# Altium schematic symbol library MCU_ST_STM32F4.SchLib: 211 symbols (part 7 of 10)
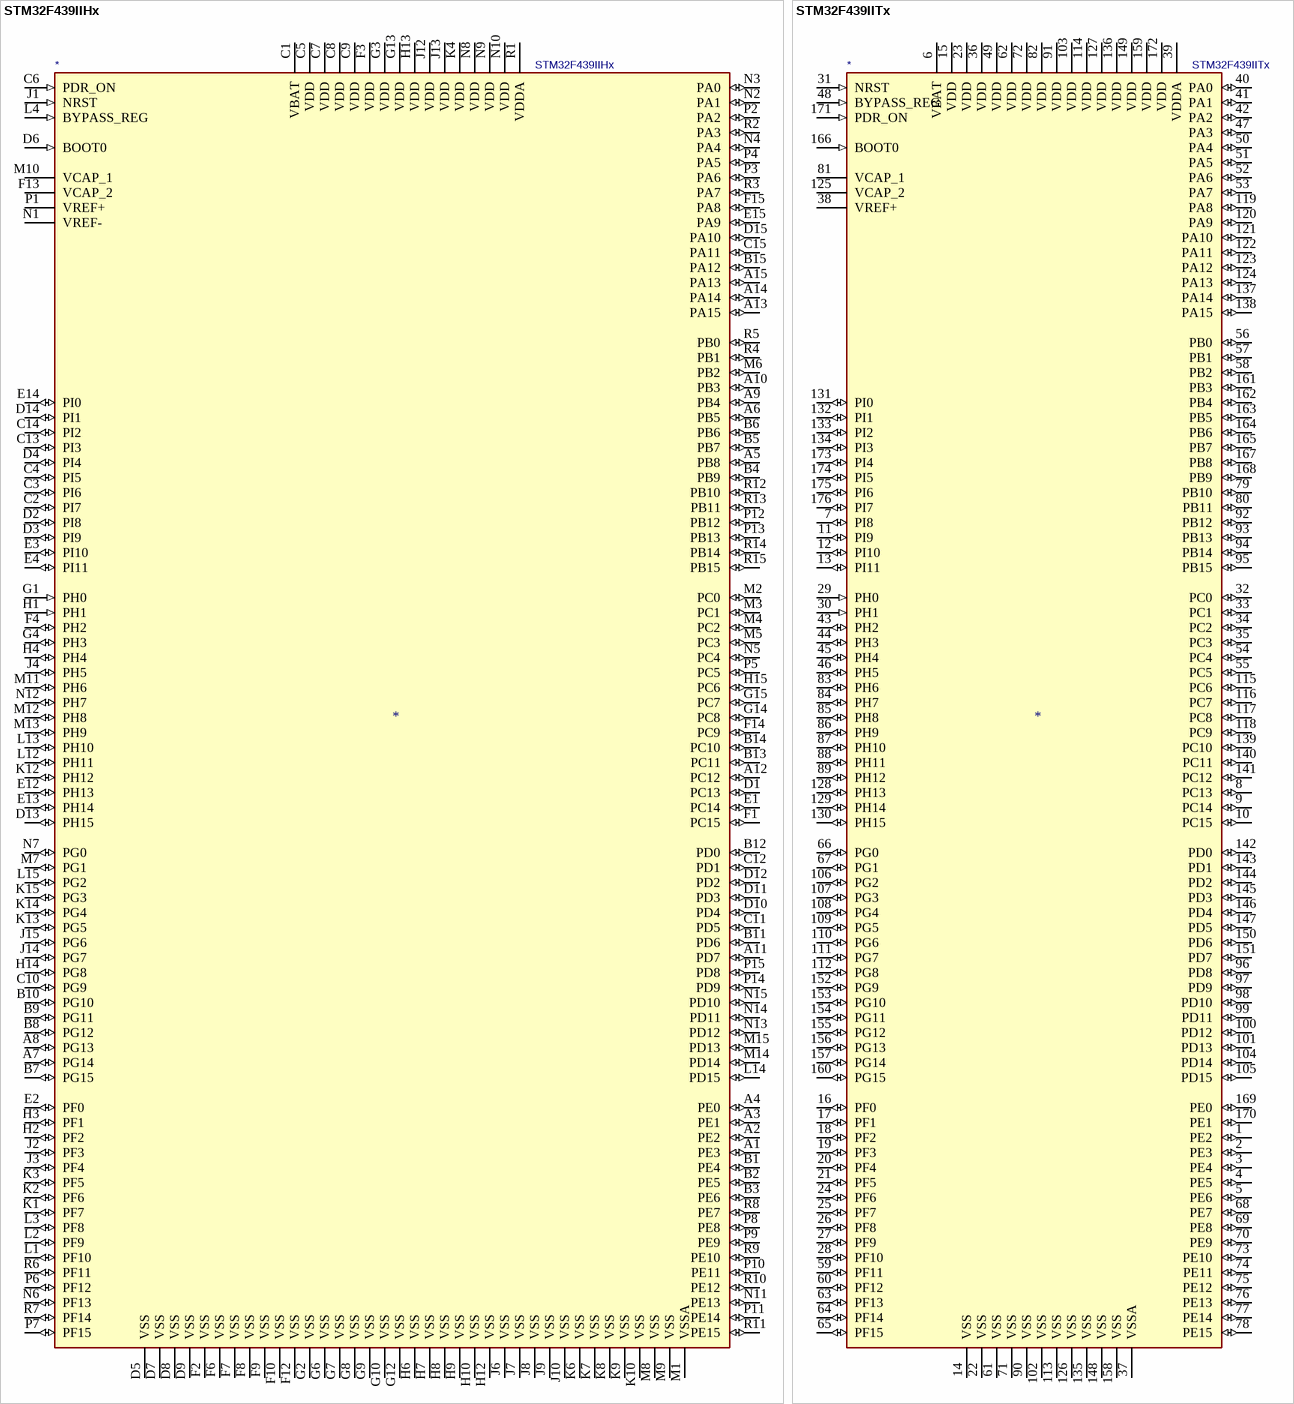
[diagram p68: symbols STM32F439IIHx to STM32F439IITx]

## STM32F439IITx
designator *  value STM32F439IITx
ki_keywords: ARM Cortex-M4 STM32F4 STM32F429/439; ki_description: ARM Cortex-M4 MCU, 2048KB flash, 192KB RAM, 180MHz, 1.7-3.6V, 140 GPIO, LQFP-176; ki_fp_filters: LQFP*24x24mm*P0.5mm*; Footprint: Package_QFP:LQFP-176_24x24mm_P0.5mm; Supplier: http://www.st.com/st-web-ui/static/active/en/resource/technical/document/datasheet/DM00077036.pdf
footprint LQFP-176_24x24mm_P0.5mm
pins: 1 PE2 (io), 2 PE3 (io), 3 PE4 (io), 4 PE5 (io), 5 PE6 (io), 6 VBAT (power), 7 PI8 (io), 8 PC13 (io), 9 PC14 (io), 10 PC15 (io), 11 PI9 (io), 12 PI10 (io), 13 PI11 (io), 14 VSS (power), 15 VDD (power), 16 PF0 (io), 17 PF1 (io), 18 PF2 (io), 19 PF3 (io), 20 PF4 (io), 21 PF5 (io), 22 VSS (power), 23 VDD (power), 24 PF6 (io), 25 PF7 (io), 26 PF8 (io), 27 PF9 (io), 28 PF10 (io), 29 PH0 (in), 30 PH1 (in), 31 NRST (in), 32 PC0 (io), 33 PC1 (io), 34 PC2 (io), 35 PC3 (io), 36 VDD (power), 37 VSSA (power), 38 VREF+ (power), 39 VDDA (power), 40 PA0 (io), 41 PA1 (io), 42 PA2 (io), 43 PH2 (io), 44 PH3 (io), 45 PH4 (io), 46 PH5 (io), 47 PA3 (io), 48 BYPASS_REG (in), 49 VDD (power), 50 PA4 (io), 51 PA5 (io), 52 PA6 (io), 53 PA7 (io), 54 PC4 (io), 55 PC5 (io), 56 PB0 (io), 57 PB1 (io), 58 PB2 (io), 59 PF11 (io), 60 PF12 (io), 61 VSS (power), 62 VDD (power), 63 PF13 (io), 64 PF14 (io), 65 PF15 (io), 66 PG0 (io), 67 PG1 (io), 68 PE7 (io), 69 PE8 (io), 70 PE9 (io), 71 VSS (power), 72 VDD (power), 73 PE10 (io), 74 PE11 (io), 75 PE12 (io), 76 PE13 (io), 77 PE14 (io), 78 PE15 (io), 79 PB10 (io), 80 PB11 (io), 81 VCAP_1 (power), 82 VDD (power), 83 PH6 (io), 84 PH7 (io), 85 PH8 (io), 86 PH9 (io), 87 PH10 (io), 88 PH11 (io), 89 PH12 (io), 90 VSS (power), 91 VDD (power), 92 PB12 (io), 93 PB13 (io), 94 PB14 (io), 95 PB15 (io), 96 PD8 (io), 97 PD9 (io), 98 PD10 (io), 99 PD11 (io), 100 PD12 (io), 101 PD13 (io), 102 VSS (power), 103 VDD (power), 104 PD14 (io), 105 PD15 (io), 106 PG2 (io), 107 PG3 (io), 108 PG4 (io), 109 PG5 (io), 110 PG6 (io), 111 PG7 (io), 112 PG8 (io), 113 VSS (power), 114 VDD (power), 115 PC6 (io), 116 PC7 (io), 117 PC8 (io), 118 PC9 (io), 119 PA8 (io), 120 PA9 (io), 121 PA10 (io), 122 PA11 (io), 123 PA12 (io), 124 PA13 (io), 125 VCAP_2 (power), 126 VSS (power), 127 VDD (power), 128 PH13 (io), 129 PH14 (io), 130 PH15 (io), 131 PI0 (io), 132 PI1 (io), 133 PI2 (io), 134 PI3 (io), 135 VSS (power), 136 VDD (power), 137 PA14 (io), 138 PA15 (io), 139 PC10 (io), 140 PC11 (io), 141 PC12 (io), 142 PD0 (io), 143 PD1 (io), 144 PD2 (io), 145 PD3 (io), 146 PD4 (io), 147 PD5 (io), 148 VSS (power), 149 VDD (power), 150 PD6 (io), 151 PD7 (io), 152 PG9 (io), 153 PG10 (io), 154 PG11 (io), 155 PG12 (io), 156 PG13 (io), 157 PG14 (io), 158 VSS (power), 159 VDD (power), 160 PG15 (io), 161 PB3 (io), 162 PB4 (io), 163 PB5 (io), 164 PB6 (io), 165 PB7 (io), 166 BOOT0 (in), 167 PB8 (io), 168 PB9 (io), 169 PE0 (io), 170 PE1 (io), 171 PDR_ON (in), 172 VDD (power), 173 PI4 (io), 174 PI5 (io), 175 PI6 (io), 176 PI7 (io)

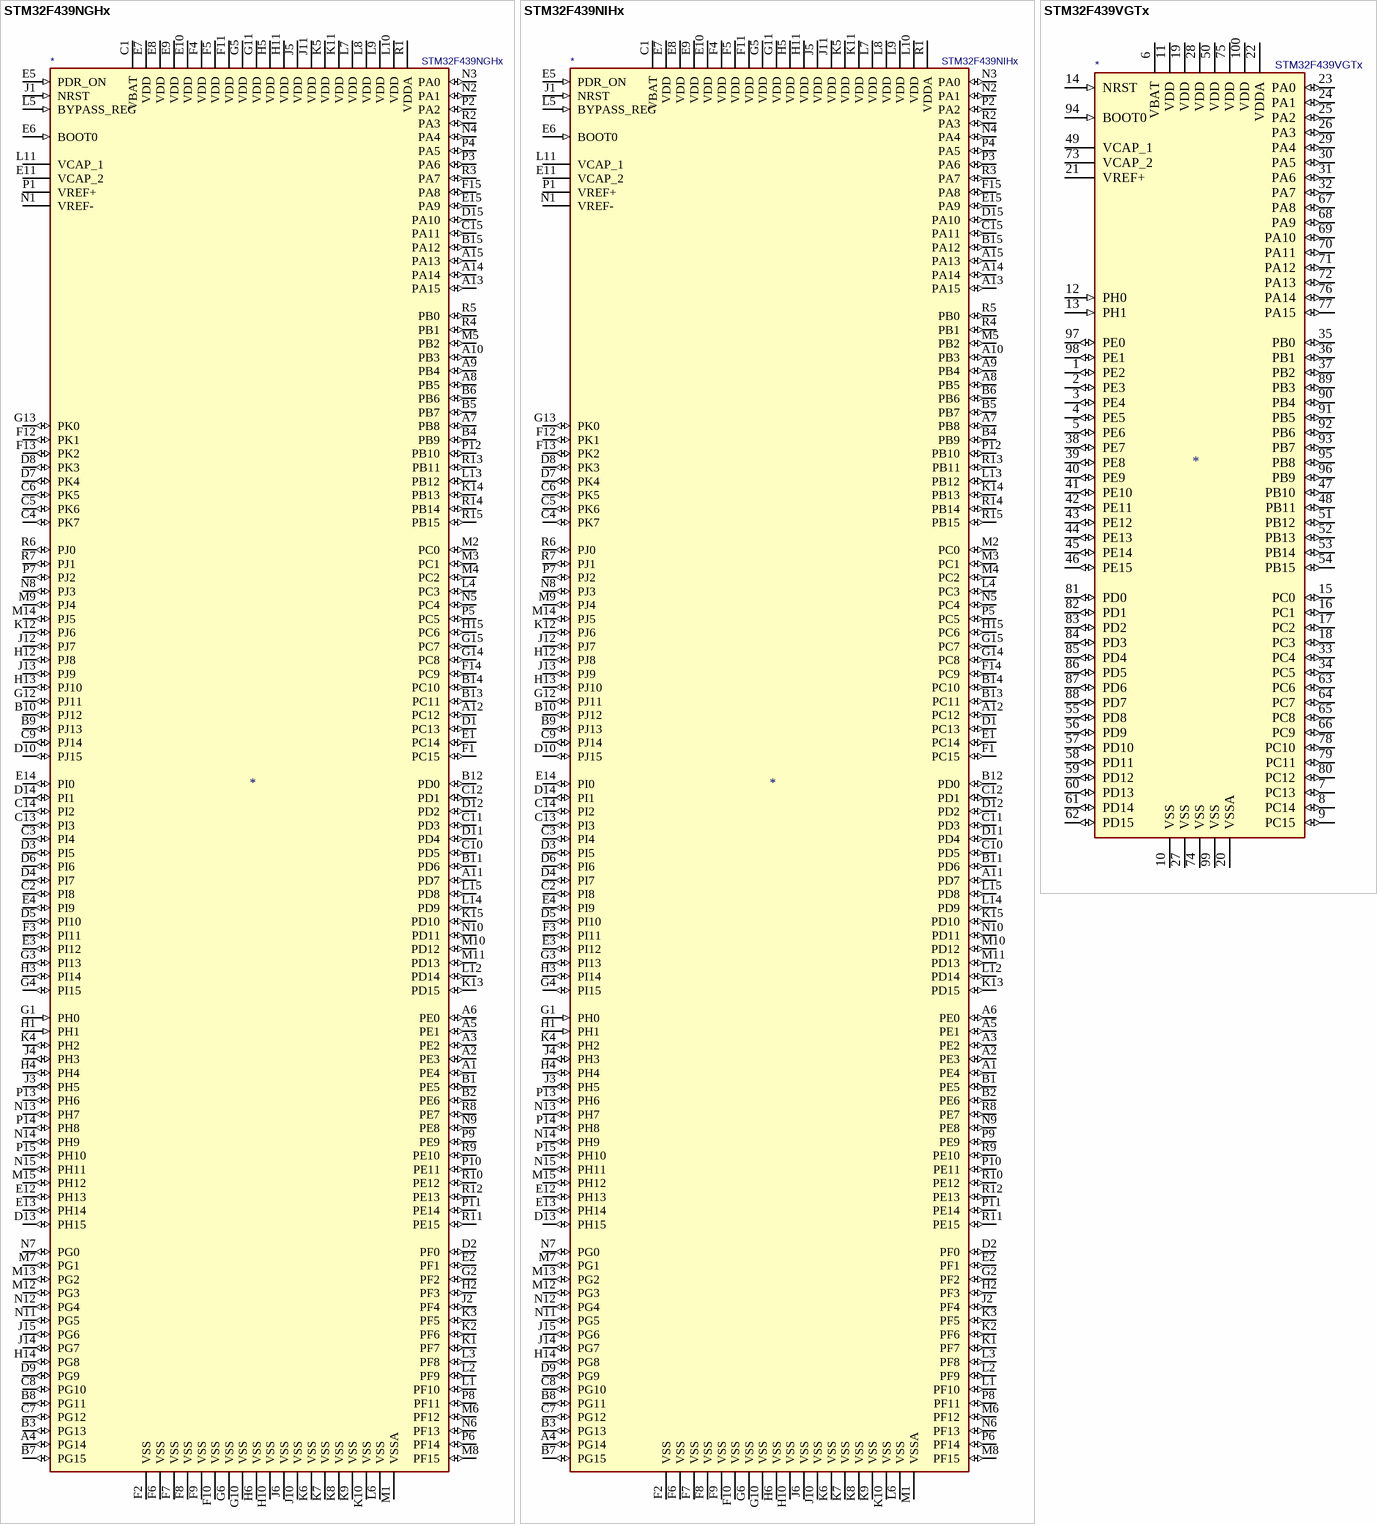
[diagram p41: symbols STM32F439NGHx to STM32F439VGTx]

## STM32F439NGHx
designator *  value STM32F439NGHx
ki_keywords: ARM Cortex-M4 STM32F4 STM32F429/439; ki_description: ARM Cortex-M4 MCU, 1024KB flash, 192KB RAM, 180MHz, 1.7-3.6V, 168 GPIO, TFBGA-216; ki_fp_filters: TFBGA*13x13mm*Layout15x15*P0.8mm*; Footprint: Package_BGA:TFBGA-216_13x13mm_Layout15x15_P0.8mm; Supplier: http://www.st.com/st-web-ui/static/active/en/resource/technical/document/datasheet/DM00077036.pdf
footprint TFBGA-216_13x13mm_Layout15x15_P0.8mm
pins: A1 PE4 (io), A2 PE3 (io), A3 PE2 (io), A4 PG14 (io), A5 PE1 (io), A6 PE0 (io), A7 PB8 (io), A8 PB5 (io), A9 PB4 (io), A10 PB3 (io), A11 PD7 (io), A12 PC12 (io), A13 PA15 (io), A14 PA14 (io), A15 PA13 (io), B1 PE5 (io), B2 PE6 (io), B3 PG13 (io), B4 PB9 (io), B5 PB7 (io), B6 PB6 (io), B7 PG15 (io), B8 PG11 (io), B9 PJ13 (io), B10 PJ12 (io), B11 PD6 (io), B12 PD0 (io), B13 PC11 (io), B14 PC10 (io), B15 PA12 (io), C1 VBAT (power), C2 PI8 (io), C3 PI4 (io), C4 PK7 (io), C5 PK6 (io), C6 PK5 (io), C7 PG12 (io), C8 PG10 (io), C9 PJ14 (io), C10 PD5 (io), C11 PD3 (io), C12 PD1 (io), C13 PI3 (io), C14 PI2 (io), C15 PA11 (io), D1 PC13 (io), D2 PF0 (io), D3 PI5 (io), D4 PI7 (io), D5 PI10 (io), D6 PI6 (io), D7 PK4 (io), D8 PK3 (io), D9 PG9 (io), D10 PJ15 (io), D11 PD4 (io), D12 PD2 (io), D13 PH15 (io), D14 PI1 (io), D15 PA10 (io), E1 PC14 (io), E2 PF1 (io), E3 PI12 (io), E4 PI9 (io), E5 PDR_ON (in), E6 BOOT0 (in), E7 VDD (power), E8 VDD (power), E9 VDD (power), E10 VDD (power), E11 VCAP_2 (power), E12 PH13 (io), E13 PH14 (io), E14 PI0 (io), E15 PA9 (io), F1 PC15 (io), F2 VSS (power), F3 PI11 (io), F4 VDD (power), F5 VDD (power), F6 VSS (power), F7 VSS (power), F8 VSS (power), F9 VSS (power), F10 VSS (power), F11 VDD (power), F12 PK1 (io), F13 PK2 (io), F14 PC9 (io), F15 PA8 (io), G1 PH0 (in), G2 PF2 (io), G3 PI13 (io), G4 PI15 (io), G5 VDD (power), G6 VSS (power), G10 VSS (power), G11 VDD (power), G12 PJ11 (io), G13 PK0 (io), G14 PC8 (io), G15 PC7 (io), H1 PH1 (in), H2 PF3 (io), H3 PI14 (io), H4 PH4 (io), H5 VDD (power), H6 VSS (power), H10 VSS (power), H11 VDD (power), H12 PJ8 (io), H13 PJ10 (io), H14 PG8 (io), H15 PC6 (io), J1 NRST (in), J2 PF4 (io), J3 PH5 (io), J4 PH3 (io), J5 VDD (power), J6 VSS (power), J10 VSS (power), J11 VDD (power), J12 PJ7 (io), J13 PJ9 (io), J14 PG7 (io), J15 PG6 (io), K1 PF7 (io), K2 PF6 (io), K3 PF5 (io), K4 PH2 (io), K5 VDD (power), K6 VSS (power), K7 VSS (power), K8 VSS (power), K9 VSS (power), K10 VSS (power), K11 VDD (power), K12 PJ6 (io), K13 PD15 (io), K14 PB13 (io), K15 PD10 (io), L1 PF10 (io), L2 PF9 (io), L3 PF8 (io), L4 PC3 (io), L5 BYPASS_REG (in), L6 VSS (power), L7 VDD (power), L8 VDD (power), L9 VDD (power), L10 VDD (power), L11 VCAP_1 (power), L12 PD14 (io), L13 PB12 (io), L14 PD9 (io), L15 PD8 (io), M1 VSSA (power), M2 PC0 (io), M3 PC1 (io), M4 PC2 (io), M5 PB2 (io), M6 PF12 (io), M7 PG1 (io), M8 PF15 (io), M9 PJ4 (io), M10 PD12 (io), M11 PD13 (io), M12 PG3 (io), M13 PG2 (io), M14 PJ5 (io), M15 PH12 (io), N1 VREF- (power), N2 PA1 (io), N3 PA0 (io), N4 PA4 (io), N5 PC4 (io), N6 PF13 (io), N7 PG0 (io), N8 PJ3 (io), N9 PE8 (io), N10 PD11 (io), N11 PG5 (io), N12 PG4 (io), N13 PH7 (io), N14 PH9 (io), N15 PH11 (io), P1 VREF+ (power), P2 PA2 (io), P3 PA6 (io), P4 PA5 (io), P5 PC5 (io), P6 PF14 (io), P7 PJ2 (io), P8 PF11 (io), P9 PE9 (io), P10 PE11 (io), P11 PE14 (io), P12 PB10 (io), P13 PH6 (io), P14 PH8 (io), P15 PH10 (io), R1 VDDA (power), R2 PA3 (io), R3 PA7 (io), R4 PB1 (io), R5 PB0 (io), R6 PJ0 (io), R7 PJ1 (io), R8 PE7 (io), R9 PE10 (io), R10 PE12 (io), R11 PE15 (io), R12 PE13 (io), R13 PB11 (io), R14 PB14 (io), R15 PB15 (io)

## STM32F439NIHx
designator *  value STM32F439NIHx
ki_keywords: ARM Cortex-M4 STM32F4 STM32F429/439; ki_description: ARM Cortex-M4 MCU, 2048KB flash, 192KB RAM, 180MHz, 1.7-3.6V, 168 GPIO, TFBGA-216; ki_fp_filters: TFBGA*13x13mm*Layout15x15*P0.8mm*; Footprint: Package_BGA:TFBGA-216_13x13mm_Layout15x15_P0.8mm; Supplier: http://www.st.com/st-web-ui/static/active/en/resource/technical/document/datasheet/DM00077036.pdf
footprint TFBGA-216_13x13mm_Layout15x15_P0.8mm
pins: A1 PE4 (io), A2 PE3 (io), A3 PE2 (io), A4 PG14 (io), A5 PE1 (io), A6 PE0 (io), A7 PB8 (io), A8 PB5 (io), A9 PB4 (io), A10 PB3 (io), A11 PD7 (io), A12 PC12 (io), A13 PA15 (io), A14 PA14 (io), A15 PA13 (io), B1 PE5 (io), B2 PE6 (io), B3 PG13 (io), B4 PB9 (io), B5 PB7 (io), B6 PB6 (io), B7 PG15 (io), B8 PG11 (io), B9 PJ13 (io), B10 PJ12 (io), B11 PD6 (io), B12 PD0 (io), B13 PC11 (io), B14 PC10 (io), B15 PA12 (io), C1 VBAT (power), C2 PI8 (io), C3 PI4 (io), C4 PK7 (io), C5 PK6 (io), C6 PK5 (io), C7 PG12 (io), C8 PG10 (io), C9 PJ14 (io), C10 PD5 (io), C11 PD3 (io), C12 PD1 (io), C13 PI3 (io), C14 PI2 (io), C15 PA11 (io), D1 PC13 (io), D2 PF0 (io), D3 PI5 (io), D4 PI7 (io), D5 PI10 (io), D6 PI6 (io), D7 PK4 (io), D8 PK3 (io), D9 PG9 (io), D10 PJ15 (io), D11 PD4 (io), D12 PD2 (io), D13 PH15 (io), D14 PI1 (io), D15 PA10 (io), E1 PC14 (io), E2 PF1 (io), E3 PI12 (io), E4 PI9 (io), E5 PDR_ON (in), E6 BOOT0 (in), E7 VDD (power), E8 VDD (power), E9 VDD (power), E10 VDD (power), E11 VCAP_2 (power), E12 PH13 (io), E13 PH14 (io), E14 PI0 (io), E15 PA9 (io), F1 PC15 (io), F2 VSS (power), F3 PI11 (io), F4 VDD (power), F5 VDD (power), F6 VSS (power), F7 VSS (power), F8 VSS (power), F9 VSS (power), F10 VSS (power), F11 VDD (power), F12 PK1 (io), F13 PK2 (io), F14 PC9 (io), F15 PA8 (io), G1 PH0 (in), G2 PF2 (io), G3 PI13 (io), G4 PI15 (io), G5 VDD (power), G6 VSS (power), G10 VSS (power), G11 VDD (power), G12 PJ11 (io), G13 PK0 (io), G14 PC8 (io), G15 PC7 (io), H1 PH1 (in), H2 PF3 (io), H3 PI14 (io), H4 PH4 (io), H5 VDD (power), H6 VSS (power), H10 VSS (power), H11 VDD (power), H12 PJ8 (io), H13 PJ10 (io), H14 PG8 (io), H15 PC6 (io), J1 NRST (in), J2 PF4 (io), J3 PH5 (io), J4 PH3 (io), J5 VDD (power), J6 VSS (power), J10 VSS (power), J11 VDD (power), J12 PJ7 (io), J13 PJ9 (io), J14 PG7 (io), J15 PG6 (io), K1 PF7 (io), K2 PF6 (io), K3 PF5 (io), K4 PH2 (io), K5 VDD (power), K6 VSS (power), K7 VSS (power), K8 VSS (power), K9 VSS (power), K10 VSS (power), K11 VDD (power), K12 PJ6 (io), K13 PD15 (io), K14 PB13 (io), K15 PD10 (io), L1 PF10 (io), L2 PF9 (io), L3 PF8 (io), L4 PC3 (io), L5 BYPASS_REG (in), L6 VSS (power), L7 VDD (power), L8 VDD (power), L9 VDD (power), L10 VDD (power), L11 VCAP_1 (power), L12 PD14 (io), L13 PB12 (io), L14 PD9 (io), L15 PD8 (io), M1 VSSA (power), M2 PC0 (io), M3 PC1 (io), M4 PC2 (io), M5 PB2 (io), M6 PF12 (io), M7 PG1 (io), M8 PF15 (io), M9 PJ4 (io), M10 PD12 (io), M11 PD13 (io), M12 PG3 (io), M13 PG2 (io), M14 PJ5 (io), M15 PH12 (io), N1 VREF- (power), N2 PA1 (io), N3 PA0 (io), N4 PA4 (io), N5 PC4 (io), N6 PF13 (io), N7 PG0 (io), N8 PJ3 (io), N9 PE8 (io), N10 PD11 (io), N11 PG5 (io), N12 PG4 (io), N13 PH7 (io), N14 PH9 (io), N15 PH11 (io), P1 VREF+ (power), P2 PA2 (io), P3 PA6 (io), P4 PA5 (io), P5 PC5 (io), P6 PF14 (io), P7 PJ2 (io), P8 PF11 (io), P9 PE9 (io), P10 PE11 (io), P11 PE14 (io), P12 PB10 (io), P13 PH6 (io), P14 PH8 (io), P15 PH10 (io), R1 VDDA (power), R2 PA3 (io), R3 PA7 (io), R4 PB1 (io), R5 PB0 (io), R6 PJ0 (io), R7 PJ1 (io), R8 PE7 (io), R9 PE10 (io), R10 PE12 (io), R11 PE15 (io), R12 PE13 (io), R13 PB11 (io), R14 PB14 (io), R15 PB15 (io)

## STM32F439VGTx
designator *  value STM32F439VGTx
ki_keywords: ARM Cortex-M4 STM32F4 STM32F429/439; ki_description: ARM Cortex-M4 MCU, 1024KB flash, 192KB RAM, 180MHz, 1.7-3.6V, 82 GPIO, LQFP-100; ki_fp_filters: LQFP*14x14mm*P0.5mm*; Footprint: Package_QFP:LQFP-100_14x14mm_P0.5mm; Supplier: http://www.st.com/st-web-ui/static/active/en/resource/technical/document/datasheet/DM00077036.pdf
footprint LQFP-100_14x14mm_P0.5mm
pins: 1 PE2 (io), 2 PE3 (io), 3 PE4 (io), 4 PE5 (io), 5 PE6 (io), 6 VBAT (power), 7 PC13 (io), 8 PC14 (io), 9 PC15 (io), 10 VSS (power), 11 VDD (power), 12 PH0 (in), 13 PH1 (in), 14 NRST (in), 15 PC0 (io), 16 PC1 (io), 17 PC2 (io), 18 PC3 (io), 19 VDD (power), 20 VSSA (power), 21 VREF+ (power), 22 VDDA (power), 23 PA0 (io), 24 PA1 (io), 25 PA2 (io), 26 PA3 (io), 27 VSS (power), 28 VDD (power), 29 PA4 (io), 30 PA5 (io), 31 PA6 (io), 32 PA7 (io), 33 PC4 (io), 34 PC5 (io), 35 PB0 (io), 36 PB1 (io), 37 PB2 (io), 38 PE7 (io), 39 PE8 (io), 40 PE9 (io), 41 PE10 (io), 42 PE11 (io), 43 PE12 (io), 44 PE13 (io), 45 PE14 (io), 46 PE15 (io), 47 PB10 (io), 48 PB11 (io), 49 VCAP_1 (power), 50 VDD (power), 51 PB12 (io), 52 PB13 (io), 53 PB14 (io), 54 PB15 (io), 55 PD8 (io), 56 PD9 (io), 57 PD10 (io), 58 PD11 (io), 59 PD12 (io), 60 PD13 (io), 61 PD14 (io), 62 PD15 (io), 63 PC6 (io), 64 PC7 (io), 65 PC8 (io), 66 PC9 (io), 67 PA8 (io), 68 PA9 (io), 69 PA10 (io), 70 PA11 (io), 71 PA12 (io), 72 PA13 (io), 73 VCAP_2 (power), 74 VSS (power), 75 VDD (power), 76 PA14 (io), 77 PA15 (io), 78 PC10 (io), 79 PC11 (io), 80 PC12 (io), 81 PD0 (io), 82 PD1 (io), 83 PD2 (io), 84 PD3 (io), 85 PD4 (io), 86 PD5 (io), 87 PD6 (io), 88 PD7 (io), 89 PB3 (io), 90 PB4 (io), 91 PB5 (io), 92 PB6 (io), 93 PB7 (io), 94 BOOT0 (in), 95 PB8 (io), 96 PB9 (io), 97 PE0 (io), 98 PE1 (io), 99 VSS (power), 100 VDD (power)

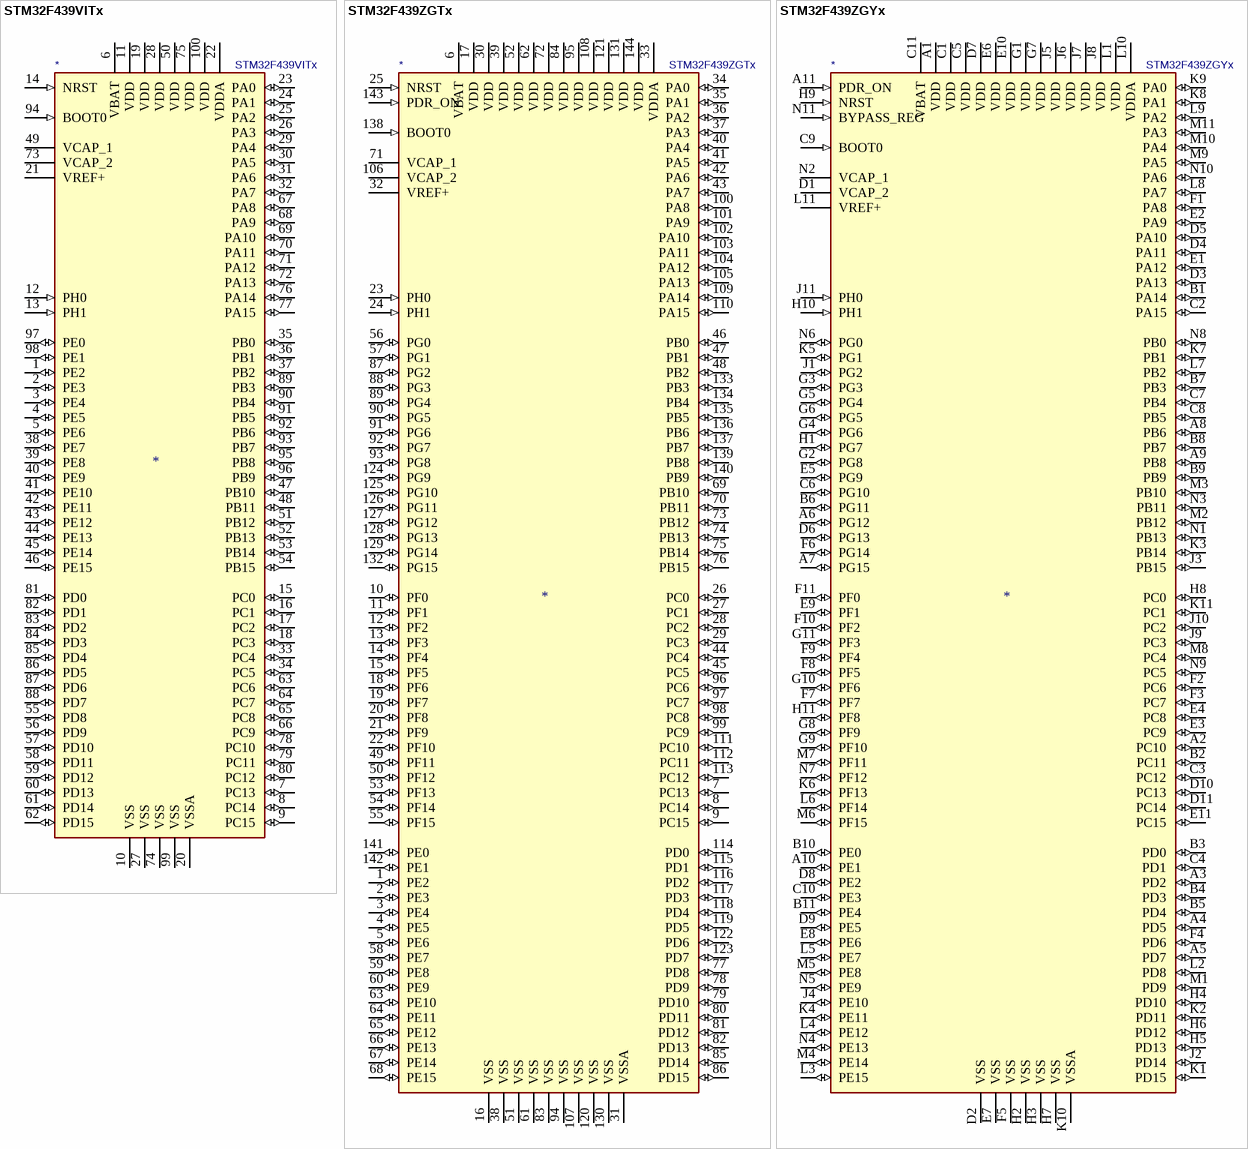
[diagram p42: symbols STM32F439VITx to STM32F439ZGYx]

## STM32F439VITx
designator *  value STM32F439VITx
ki_keywords: ARM Cortex-M4 STM32F4 STM32F429/439; ki_description: ARM Cortex-M4 MCU, 2048KB flash, 192KB RAM, 180MHz, 1.7-3.6V, 82 GPIO, LQFP-100; ki_fp_filters: LQFP*14x14mm*P0.5mm*; Footprint: Package_QFP:LQFP-100_14x14mm_P0.5mm; Supplier: http://www.st.com/st-web-ui/static/active/en/resource/technical/document/datasheet/DM00077036.pdf
footprint LQFP-100_14x14mm_P0.5mm
pins: 1 PE2 (io), 2 PE3 (io), 3 PE4 (io), 4 PE5 (io), 5 PE6 (io), 6 VBAT (power), 7 PC13 (io), 8 PC14 (io), 9 PC15 (io), 10 VSS (power), 11 VDD (power), 12 PH0 (in), 13 PH1 (in), 14 NRST (in), 15 PC0 (io), 16 PC1 (io), 17 PC2 (io), 18 PC3 (io), 19 VDD (power), 20 VSSA (power), 21 VREF+ (power), 22 VDDA (power), 23 PA0 (io), 24 PA1 (io), 25 PA2 (io), 26 PA3 (io), 27 VSS (power), 28 VDD (power), 29 PA4 (io), 30 PA5 (io), 31 PA6 (io), 32 PA7 (io), 33 PC4 (io), 34 PC5 (io), 35 PB0 (io), 36 PB1 (io), 37 PB2 (io), 38 PE7 (io), 39 PE8 (io), 40 PE9 (io), 41 PE10 (io), 42 PE11 (io), 43 PE12 (io), 44 PE13 (io), 45 PE14 (io), 46 PE15 (io), 47 PB10 (io), 48 PB11 (io), 49 VCAP_1 (power), 50 VDD (power), 51 PB12 (io), 52 PB13 (io), 53 PB14 (io), 54 PB15 (io), 55 PD8 (io), 56 PD9 (io), 57 PD10 (io), 58 PD11 (io), 59 PD12 (io), 60 PD13 (io), 61 PD14 (io), 62 PD15 (io), 63 PC6 (io), 64 PC7 (io), 65 PC8 (io), 66 PC9 (io), 67 PA8 (io), 68 PA9 (io), 69 PA10 (io), 70 PA11 (io), 71 PA12 (io), 72 PA13 (io), 73 VCAP_2 (power), 74 VSS (power), 75 VDD (power), 76 PA14 (io), 77 PA15 (io), 78 PC10 (io), 79 PC11 (io), 80 PC12 (io), 81 PD0 (io), 82 PD1 (io), 83 PD2 (io), 84 PD3 (io), 85 PD4 (io), 86 PD5 (io), 87 PD6 (io), 88 PD7 (io), 89 PB3 (io), 90 PB4 (io), 91 PB5 (io), 92 PB6 (io), 93 PB7 (io), 94 BOOT0 (in), 95 PB8 (io), 96 PB9 (io), 97 PE0 (io), 98 PE1 (io), 99 VSS (power), 100 VDD (power)

## STM32F439ZGTx
designator *  value STM32F439ZGTx
ki_keywords: ARM Cortex-M4 STM32F4 STM32F429/439; ki_description: ARM Cortex-M4 MCU, 1024KB flash, 192KB RAM, 180MHz, 1.7-3.6V, 114 GPIO, LQFP-144; ki_fp_filters: LQFP*20x20mm*P0.5mm*; Footprint: Package_QFP:LQFP-144_20x20mm_P0.5mm; Supplier: http://www.st.com/st-web-ui/static/active/en/resource/technical/document/datasheet/DM00077036.pdf
footprint LQFP-144_20x20mm_P0.5mm
pins: 1 PE2 (io), 2 PE3 (io), 3 PE4 (io), 4 PE5 (io), 5 PE6 (io), 6 VBAT (power), 7 PC13 (io), 8 PC14 (io), 9 PC15 (io), 10 PF0 (io), 11 PF1 (io), 12 PF2 (io), 13 PF3 (io), 14 PF4 (io), 15 PF5 (io), 16 VSS (power), 17 VDD (power), 18 PF6 (io), 19 PF7 (io), 20 PF8 (io), 21 PF9 (io), 22 PF10 (io), 23 PH0 (in), 24 PH1 (in), 25 NRST (in), 26 PC0 (io), 27 PC1 (io), 28 PC2 (io), 29 PC3 (io), 30 VDD (power), 31 VSSA (power), 32 VREF+ (power), 33 VDDA (power), 34 PA0 (io), 35 PA1 (io), 36 PA2 (io), 37 PA3 (io), 38 VSS (power), 39 VDD (power), 40 PA4 (io), 41 PA5 (io), 42 PA6 (io), 43 PA7 (io), 44 PC4 (io), 45 PC5 (io), 46 PB0 (io), 47 PB1 (io), 48 PB2 (io), 49 PF11 (io), 50 PF12 (io), 51 VSS (power), 52 VDD (power), 53 PF13 (io), 54 PF14 (io), 55 PF15 (io), 56 PG0 (io), 57 PG1 (io), 58 PE7 (io), 59 PE8 (io), 60 PE9 (io), 61 VSS (power), 62 VDD (power), 63 PE10 (io), 64 PE11 (io), 65 PE12 (io), 66 PE13 (io), 67 PE14 (io), 68 PE15 (io), 69 PB10 (io), 70 PB11 (io), 71 VCAP_1 (power), 72 VDD (power), 73 PB12 (io), 74 PB13 (io), 75 PB14 (io), 76 PB15 (io), 77 PD8 (io), 78 PD9 (io), 79 PD10 (io), 80 PD11 (io), 81 PD12 (io), 82 PD13 (io), 83 VSS (power), 84 VDD (power), 85 PD14 (io), 86 PD15 (io), 87 PG2 (io), 88 PG3 (io), 89 PG4 (io), 90 PG5 (io), 91 PG6 (io), 92 PG7 (io), 93 PG8 (io), 94 VSS (power), 95 VDD (power), 96 PC6 (io), 97 PC7 (io), 98 PC8 (io), 99 PC9 (io), 100 PA8 (io), 101 PA9 (io), 102 PA10 (io), 103 PA11 (io), 104 PA12 (io), 105 PA13 (io), 106 VCAP_2 (power), 107 VSS (power), 108 VDD (power), 109 PA14 (io), 110 PA15 (io), 111 PC10 (io), 112 PC11 (io), 113 PC12 (io), 114 PD0 (io), 115 PD1 (io), 116 PD2 (io), 117 PD3 (io), 118 PD4 (io), 119 PD5 (io), 120 VSS (power), 121 VDD (power), 122 PD6 (io), 123 PD7 (io), 124 PG9 (io), 125 PG10 (io), 126 PG11 (io), 127 PG12 (io), 128 PG13 (io), 129 PG14 (io), 130 VSS (power), 131 VDD (power), 132 PG15 (io), 133 PB3 (io), 134 PB4 (io), 135 PB5 (io), 136 PB6 (io), 137 PB7 (io), 138 BOOT0 (in), 139 PB8 (io), 140 PB9 (io), 141 PE0 (io), 142 PE1 (io), 143 PDR_ON (in), 144 VDD (power)

## STM32F439ZGYx
designator *  value STM32F439ZGYx
ki_keywords: ARM Cortex-M4 STM32F4 STM32F429/439; ki_description: ARM Cortex-M4 MCU, 1024KB flash, 192KB RAM, 180MHz, 1.7-3.6V, 114 GPIO, WLCSP-143; ki_fp_filters: ST_WLCSP*Die419*; Footprint: Package_CSP:ST_WLCSP-143_Die419; Supplier: http://www.st.com/st-web-ui/static/active/en/resource/technical/document/datasheet/DM00077036.pdf
footprint ST_WLCSP-143_Die419
pins: A1 VDD (power), A2 PC10 (io), A3 PD2 (io), A4 PD5 (io), A5 PD7 (io), A6 PG12 (io), A7 PG15 (io), A8 PB6 (io), A9 PB8 (io), A10 PE1 (io), A11 PDR_ON (in), B1 PA14 (io), B2 PC11 (io), B3 PD0 (io), B4 PD3 (io), B5 PD4 (io), B6 PG11 (io), B7 PB3 (io), B8 PB7 (io), B9 PB9 (io), B10 PE0 (io), B11 PE4 (io), C1 VDD (power), C2 PA15 (io), C3 PC12 (io), C4 PD1 (io), C5 VDD (power), C6 PG10 (io), C7 PB4 (io), C8 PB5 (io), C9 BOOT0 (in), C10 PE3 (io), C11 VBAT (power), D1 VCAP_2 (power), D2 VSS (power), D3 PA13 (io), D4 PA11 (io), D5 PA10 (io), D6 PG13 (io), D7 VDD (power), D8 PE2 (io), D9 PE5 (io), D10 PC13 (io), D11 PC14 (io), E1 PA12 (io), E2 PA9 (io), E3 PC9 (io), E4 PC8 (io), E5 PG9 (io), E6 VDD (power), E7 VSS (power), E8 PE6 (io), E9 PF1 (io), E10 VDD (power), E11 PC15 (io), F1 PA8 (io), F2 PC6 (io), F3 PC7 (io), F4 PD6 (io), F5 VSS (power), F6 PG14 (io), F7 PF7 (io), F8 PF5 (io), F9 PF4 (io), F10 PF2 (io), F11 PF0 (io), G1 VDD (power), G2 PG8 (io), G3 PG3 (io), G4 PG6 (io), G5 PG4 (io), G6 PG5 (io), G7 VDD (power), G8 PF9 (io), G9 PF10 (io), G10 PF6 (io), G11 PF3 (io), H1 PG7 (io), H2 VSS (power), H3 VSS (power), H4 PD10 (io), H5 PD13 (io), H6 PD12 (io), H7 VSS (power), H8 PC0 (io), H9 NRST (in), H10 PH1 (in), H11 PF8 (io), J1 PG2 (io), J2 PD14 (io), J3 PB15 (io), J4 PE10 (io), J5 VDD (power), J6 VDD (power), J7 VDD (power), J8 VDD (power), J9 PC3 (io), J10 PC2 (io), J11 PH0 (in), K1 PD15 (io), K2 PD11 (io), K3 PB14 (io), K4 PE11 (io), K5 PG1 (io), K6 PF13 (io), K7 PB1 (io), K8 PA1 (io), K9 PA0 (io), K10 VSSA (power), K11 PC1 (io), L1 VDD (power), L2 PD8 (io), L3 PE15 (io), L4 PE12 (io), L5 PE7 (io), L6 PF14 (io), L7 PB2 (io), L8 PA7 (io), L9 PA2 (io), L10 VDDA (power), L11 VREF+ (power), M1 PD9 (io), M2 PB12 (io), M3 PB10 (io), M4 PE14 (io), M5 PE8 (io), M6 PF15 (io), M7 PF11 (io), M8 PC4 (io), M9 PA5 (io), M10 PA4 (io), M11 PA3 (io), N1 PB13 (io), N2 VCAP_1 (power), N3 PB11 (io), N4 PE13 (io), N5 PE9 (io), N6 PG0 (io), N7 PF12 (io), N8 PB0 (io), N9 PC5 (io), N10 PA6 (io), N11 BYPASS_REG (in)

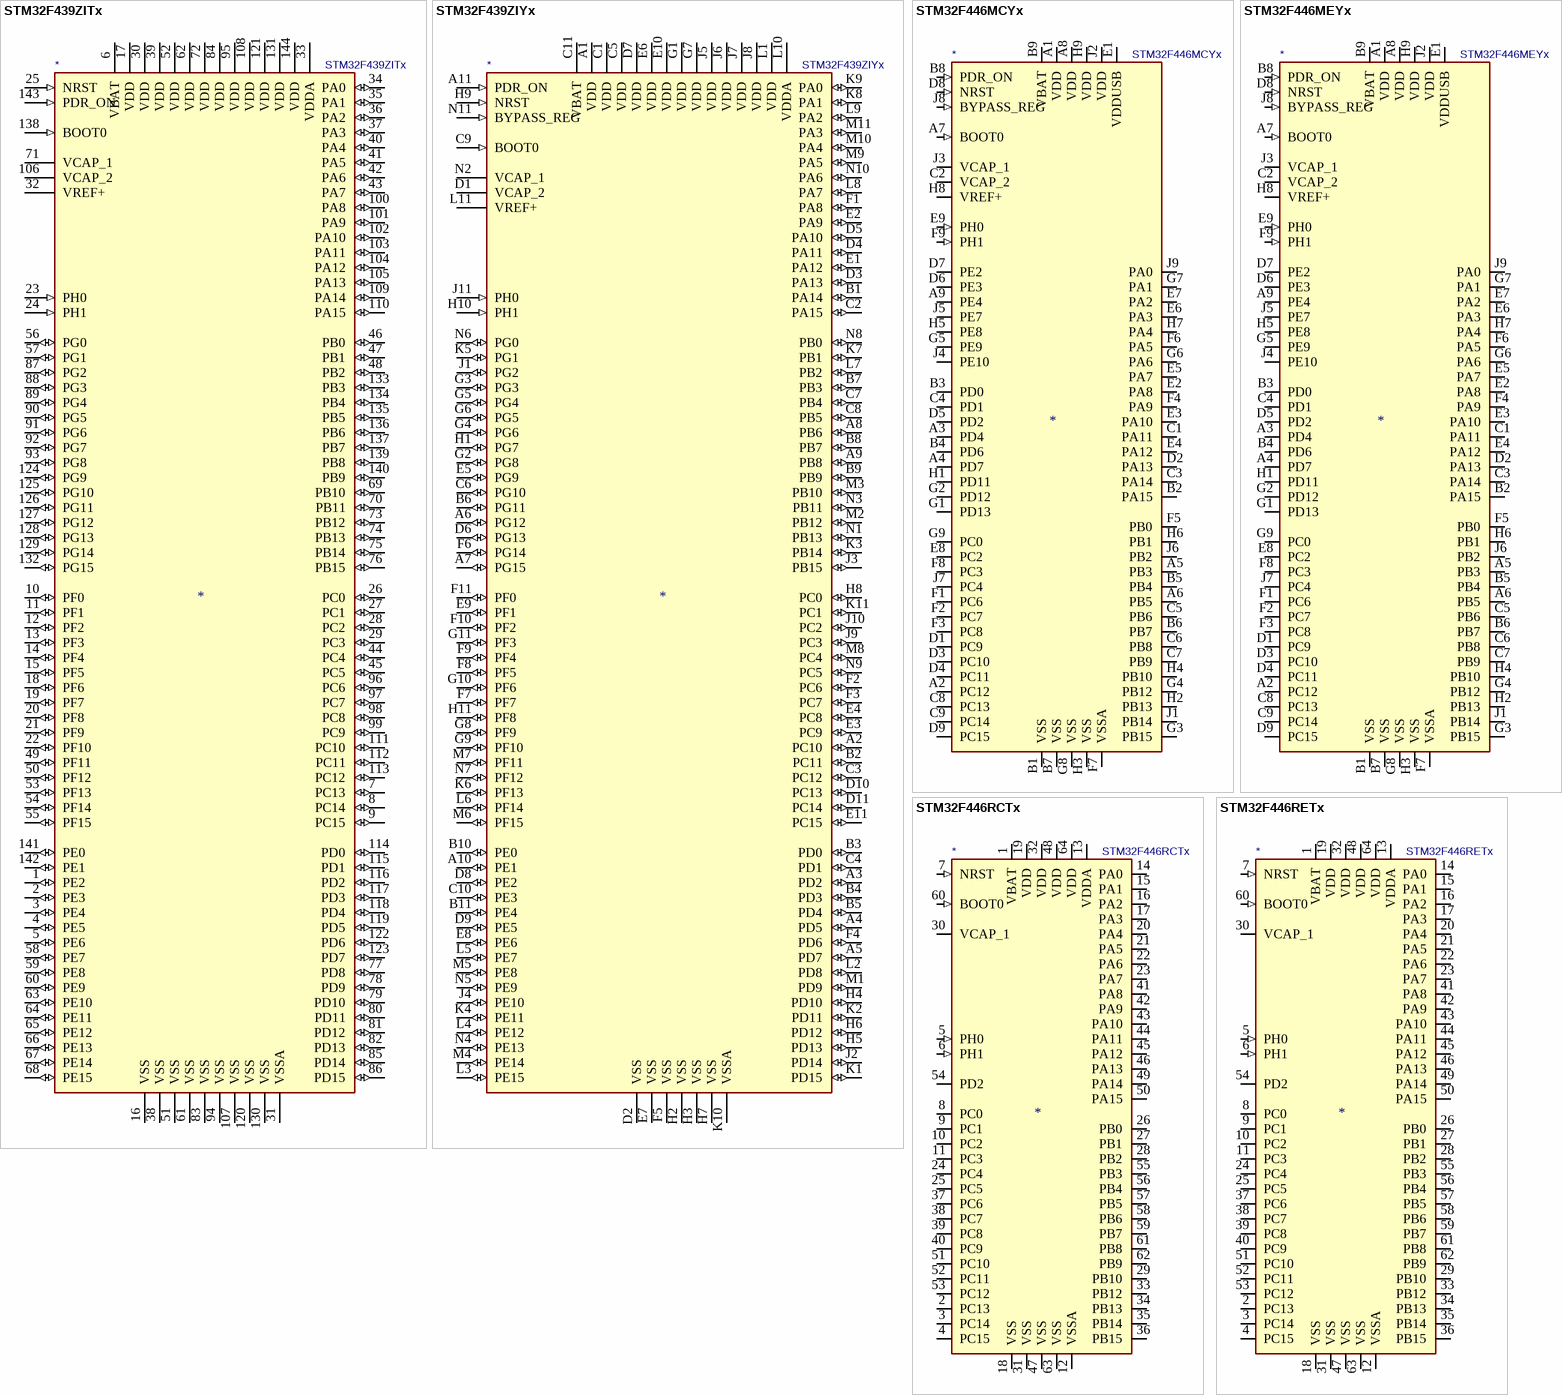
[diagram p43: symbols STM32F439ZITx to STM32F446RETx]

## STM32F439ZITx
designator *  value STM32F439ZITx
ki_keywords: ARM Cortex-M4 STM32F4 STM32F429/439; ki_description: ARM Cortex-M4 MCU, 2048KB flash, 192KB RAM, 180MHz, 1.7-3.6V, 114 GPIO, LQFP-144; ki_fp_filters: LQFP*20x20mm*P0.5mm*; Footprint: Package_QFP:LQFP-144_20x20mm_P0.5mm; Supplier: http://www.st.com/st-web-ui/static/active/en/resource/technical/document/datasheet/DM00077036.pdf
footprint LQFP-144_20x20mm_P0.5mm
pins: 1 PE2 (io), 2 PE3 (io), 3 PE4 (io), 4 PE5 (io), 5 PE6 (io), 6 VBAT (power), 7 PC13 (io), 8 PC14 (io), 9 PC15 (io), 10 PF0 (io), 11 PF1 (io), 12 PF2 (io), 13 PF3 (io), 14 PF4 (io), 15 PF5 (io), 16 VSS (power), 17 VDD (power), 18 PF6 (io), 19 PF7 (io), 20 PF8 (io), 21 PF9 (io), 22 PF10 (io), 23 PH0 (in), 24 PH1 (in), 25 NRST (in), 26 PC0 (io), 27 PC1 (io), 28 PC2 (io), 29 PC3 (io), 30 VDD (power), 31 VSSA (power), 32 VREF+ (power), 33 VDDA (power), 34 PA0 (io), 35 PA1 (io), 36 PA2 (io), 37 PA3 (io), 38 VSS (power), 39 VDD (power), 40 PA4 (io), 41 PA5 (io), 42 PA6 (io), 43 PA7 (io), 44 PC4 (io), 45 PC5 (io), 46 PB0 (io), 47 PB1 (io), 48 PB2 (io), 49 PF11 (io), 50 PF12 (io), 51 VSS (power), 52 VDD (power), 53 PF13 (io), 54 PF14 (io), 55 PF15 (io), 56 PG0 (io), 57 PG1 (io), 58 PE7 (io), 59 PE8 (io), 60 PE9 (io), 61 VSS (power), 62 VDD (power), 63 PE10 (io), 64 PE11 (io), 65 PE12 (io), 66 PE13 (io), 67 PE14 (io), 68 PE15 (io), 69 PB10 (io), 70 PB11 (io), 71 VCAP_1 (power), 72 VDD (power), 73 PB12 (io), 74 PB13 (io), 75 PB14 (io), 76 PB15 (io), 77 PD8 (io), 78 PD9 (io), 79 PD10 (io), 80 PD11 (io), 81 PD12 (io), 82 PD13 (io), 83 VSS (power), 84 VDD (power), 85 PD14 (io), 86 PD15 (io), 87 PG2 (io), 88 PG3 (io), 89 PG4 (io), 90 PG5 (io), 91 PG6 (io), 92 PG7 (io), 93 PG8 (io), 94 VSS (power), 95 VDD (power), 96 PC6 (io), 97 PC7 (io), 98 PC8 (io), 99 PC9 (io), 100 PA8 (io), 101 PA9 (io), 102 PA10 (io), 103 PA11 (io), 104 PA12 (io), 105 PA13 (io), 106 VCAP_2 (power), 107 VSS (power), 108 VDD (power), 109 PA14 (io), 110 PA15 (io), 111 PC10 (io), 112 PC11 (io), 113 PC12 (io), 114 PD0 (io), 115 PD1 (io), 116 PD2 (io), 117 PD3 (io), 118 PD4 (io), 119 PD5 (io), 120 VSS (power), 121 VDD (power), 122 PD6 (io), 123 PD7 (io), 124 PG9 (io), 125 PG10 (io), 126 PG11 (io), 127 PG12 (io), 128 PG13 (io), 129 PG14 (io), 130 VSS (power), 131 VDD (power), 132 PG15 (io), 133 PB3 (io), 134 PB4 (io), 135 PB5 (io), 136 PB6 (io), 137 PB7 (io), 138 BOOT0 (in), 139 PB8 (io), 140 PB9 (io), 141 PE0 (io), 142 PE1 (io), 143 PDR_ON (in), 144 VDD (power)

## STM32F439ZIYx
designator *  value STM32F439ZIYx
ki_keywords: ARM Cortex-M4 STM32F4 STM32F429/439; ki_description: ARM Cortex-M4 MCU, 2048KB flash, 192KB RAM, 180MHz, 1.7-3.6V, 114 GPIO, WLCSP-143; ki_fp_filters: ST_WLCSP*Die419*; Footprint: Package_CSP:ST_WLCSP-143_Die419; Supplier: http://www.st.com/st-web-ui/static/active/en/resource/technical/document/datasheet/DM00077036.pdf
footprint ST_WLCSP-143_Die419
pins: A1 VDD (power), A2 PC10 (io), A3 PD2 (io), A4 PD5 (io), A5 PD7 (io), A6 PG12 (io), A7 PG15 (io), A8 PB6 (io), A9 PB8 (io), A10 PE1 (io), A11 PDR_ON (in), B1 PA14 (io), B2 PC11 (io), B3 PD0 (io), B4 PD3 (io), B5 PD4 (io), B6 PG11 (io), B7 PB3 (io), B8 PB7 (io), B9 PB9 (io), B10 PE0 (io), B11 PE4 (io), C1 VDD (power), C2 PA15 (io), C3 PC12 (io), C4 PD1 (io), C5 VDD (power), C6 PG10 (io), C7 PB4 (io), C8 PB5 (io), C9 BOOT0 (in), C10 PE3 (io), C11 VBAT (power), D1 VCAP_2 (power), D2 VSS (power), D3 PA13 (io), D4 PA11 (io), D5 PA10 (io), D6 PG13 (io), D7 VDD (power), D8 PE2 (io), D9 PE5 (io), D10 PC13 (io), D11 PC14 (io), E1 PA12 (io), E2 PA9 (io), E3 PC9 (io), E4 PC8 (io), E5 PG9 (io), E6 VDD (power), E7 VSS (power), E8 PE6 (io), E9 PF1 (io), E10 VDD (power), E11 PC15 (io), F1 PA8 (io), F2 PC6 (io), F3 PC7 (io), F4 PD6 (io), F5 VSS (power), F6 PG14 (io), F7 PF7 (io), F8 PF5 (io), F9 PF4 (io), F10 PF2 (io), F11 PF0 (io), G1 VDD (power), G2 PG8 (io), G3 PG3 (io), G4 PG6 (io), G5 PG4 (io), G6 PG5 (io), G7 VDD (power), G8 PF9 (io), G9 PF10 (io), G10 PF6 (io), G11 PF3 (io), H1 PG7 (io), H2 VSS (power), H3 VSS (power), H4 PD10 (io), H5 PD13 (io), H6 PD12 (io), H7 VSS (power), H8 PC0 (io), H9 NRST (in), H10 PH1 (in), H11 PF8 (io), J1 PG2 (io), J2 PD14 (io), J3 PB15 (io), J4 PE10 (io), J5 VDD (power), J6 VDD (power), J7 VDD (power), J8 VDD (power), J9 PC3 (io), J10 PC2 (io), J11 PH0 (in), K1 PD15 (io), K2 PD11 (io), K3 PB14 (io), K4 PE11 (io), K5 PG1 (io), K6 PF13 (io), K7 PB1 (io), K8 PA1 (io), K9 PA0 (io), K10 VSSA (power), K11 PC1 (io), L1 VDD (power), L2 PD8 (io), L3 PE15 (io), L4 PE12 (io), L5 PE7 (io), L6 PF14 (io), L7 PB2 (io), L8 PA7 (io), L9 PA2 (io), L10 VDDA (power), L11 VREF+ (power), M1 PD9 (io), M2 PB12 (io), M3 PB10 (io), M4 PE14 (io), M5 PE8 (io), M6 PF15 (io), M7 PF11 (io), M8 PC4 (io), M9 PA5 (io), M10 PA4 (io), M11 PA3 (io), N1 PB13 (io), N2 VCAP_1 (power), N3 PB11 (io), N4 PE13 (io), N5 PE9 (io), N6 PG0 (io), N7 PF12 (io), N8 PB0 (io), N9 PC5 (io), N10 PA6 (io), N11 BYPASS_REG (in)

## STM32F446MCYx
designator *  value STM32F446MCYx
ki_keywords: ARM Cortex-M4 STM32F4 STM32F446; ki_description: ARM Cortex-M4 MCU, 256KB flash, 128KB RAM, 180MHz, 1.8-3.6V, 63 GPIO, WLCSP-81; ki_fp_filters: ST_WLCSP*Die421*; Footprint: Package_CSP:ST_WLCSP-81_Die421; Supplier: http://www.st.com/st-web-ui/static/active/en/resource/technical/document/datasheet/DM00141306.pdf
footprint ST_WLCSP-81_Die421
pins: A1 VDD (power), A2 PC12 (io), A3 PD4 (io), A4 PD7 (io), A5 PB3 (io), A6 PB5 (io), A7 BOOT0 (in), A8 VDD (power), A9 PE4 (io), B1 VSS (power), B2 PA15 (io), B3 PD0 (io), B4 PD6 (io), B5 PB4 (io), B6 PB7 (io), B7 VSS (power), B8 PDR_ON (in), B9 VBAT (power), C1 PA11 (io), C2 VCAP_2 (power), C3 PA14 (io), C4 PD1 (io), C5 PB6 (io), C6 PB8 (io), C7 PB9 (io), C8 PC13 (io), C9 PC14 (io), D1 PC9 (io), D2 PA13 (io), D3 PC10 (io), D4 PC11 (io), D5 PD2 (io), D6 PE3 (io), D7 PE2 (io), D8 NRST (in), D9 PC15 (io), E1 VDDUSB (power), E2 PA8 (io), E3 PA10 (io), E4 PA12 (io), E5 PA7 (io), E6 PA3 (io), E7 PA2 (io), E8 PC2 (io), E9 PH0 (in), F1 PC6 (io), F2 PC7 (io), F3 PC8 (io), F4 PA9 (io), F5 PB0 (io), F6 PA5 (io), F7 VSSA (power), F8 PC3 (io), F9 PH1 (in), G1 PD13 (io), G2 PD12 (io), G3 PB15 (io), G4 PB12 (io), G5 PE9 (io), G6 PA6 (io), G7 PA1 (io), G8 VSS (power), G9 PC0 (io), H1 PD11 (io), H2 PB13 (io), H3 VSS (power), H4 PB10 (io), H5 PE8 (io), H6 PB1 (io), H7 PA4 (io), H8 VREF+ (power), H9 VDD (power), J1 PB14 (io), J2 VDD (power), J3 VCAP_1 (power), J4 PE10 (io), J5 PE7 (io), J6 PB2 (io), J7 PC4 (io), J8 BYPASS_REG (in), J9 PA0 (io)